# Altium footprint library TH Connectors.PcbLib: 140 footprints (part 5 of 9)
Each footprint in its own frame and in the unit in brackets; x right, y up, seen from the top. Pads: shape width x height; smd on the part's side, far side on the other; paste and mask are expansions set on the pad; w line width, h text height; cw(c..) or ccw(c..) is an arc to the next point about the centre after c.
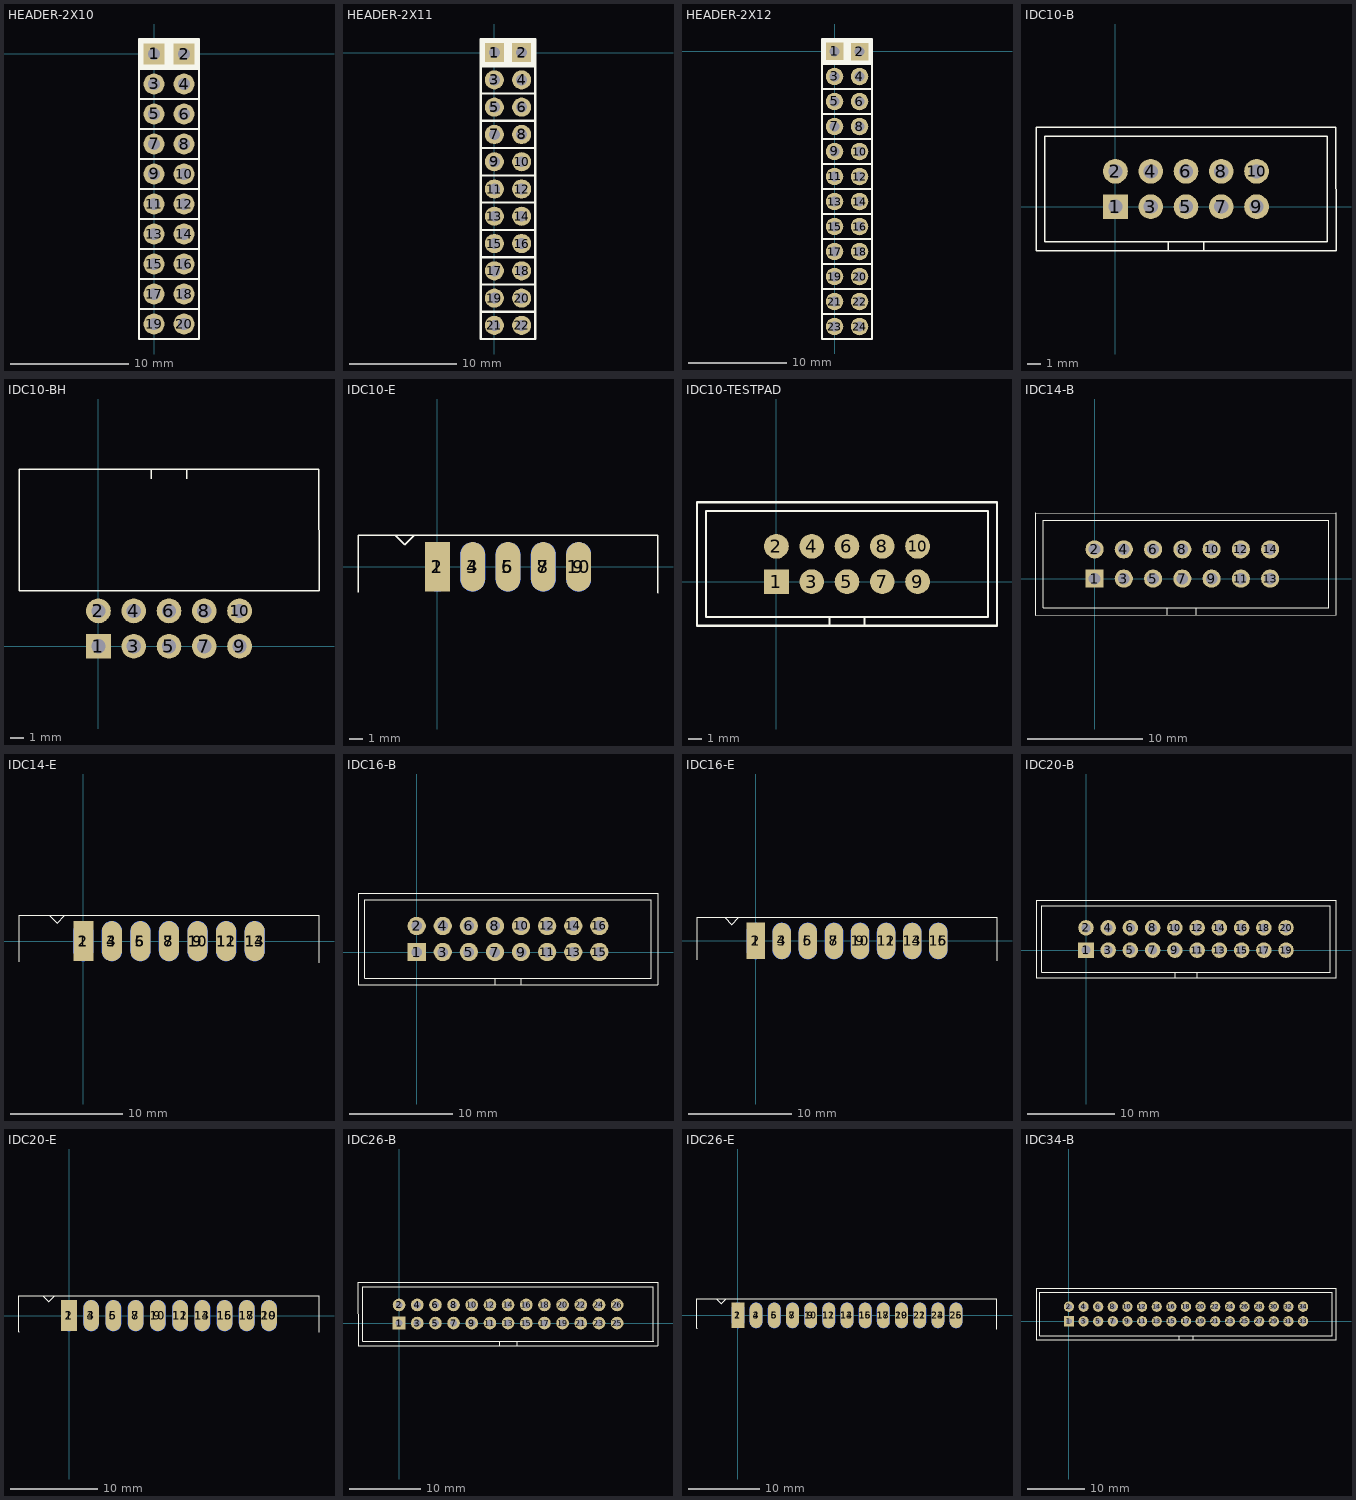
[diagram p4: the footprints below, top view; thin cyan lines are the x and y axes]

## HEADER-2X10 [mil]
pads (20):
  rect 70x70 hole 40: 1(0,0) 2(100,0)
  round 70 hole 40: 3(0,-100) 4(100,-100) 5(0,-200) 6(100,-200) 7(0,-300) 8(100,-300) 9(0,-400) 10(100,-400) 11(0,-500) 12(100,-500) 13(0,-600) 14(100,-600) 15(0,-700) 16(100,-700) 17(0,-800) 18(100,-800) 19(0,-900) 20(100,-900)
Top Overlay:
  rectangle: -50,-49.62 50,50
  rectangle: 50,-49.62 150,50
  lines w8: -50,-250 50,-250 150,-250 ; -50,-150 50,-150 150,-150 ; -50,-50 50,-50 150,-50 ; 50,-850 -50,-850 50,-850 ; 50,-850 150,-850 50,-850 ; 50,-750 -50,-750 50,-750 ; 50,-750 150,-750 50,-750 ; 50,-650 -50,-650 50,-650 ; 50,-650 150,-650 50,-650 ; 50,-550 -50,-550 50,-550 ; 50,-550 150,-550 50,-550 ; 50,-450 -50,-450 50,-450 ; 50,-450 150,-450 50,-450 ; 50,-350 -50,-350 50,-350 ; 50,-350 150,-350 50,-350 ; -50,-950 50,-950 150,-950 150,50 50,50 -50,50 -50,-950
3D body: height 470, standoff -120, extent -15,-215 15,-185
3D body: height 100, standoff 0, extent -50,-950 150,50
3D body: height 470, standoff -120, extent -15,-115 15,-85
3D body: height 470, standoff -120, extent -15,-15 15,15
3D body: height 470, standoff -120, extent -15,-315 15,-285
3D body: height 470, standoff -120, extent -15,-415 15,-385
3D body: height 470, standoff -120, extent -15,-515 15,-485
3D body: height 470, standoff -120, extent -15,-615 15,-585
3D body: height 470, standoff -120, extent -15,-715 15,-685
3D body: height 470, standoff -120, extent -15,-815 15,-785
3D body: height 470, standoff -120, extent -15,-915 15,-885
3D body: height 101, standoff 100, extent -35,-35 35.5,35
3D body: height 101, standoff 100, extent 65,-35 135.5,35
3D body: height 470, standoff -120, extent 85,-915 115,-885
3D body: height 470, standoff -120, extent 85,-815 115,-785
3D body: height 470, standoff -120, extent 85,-715 115,-685
3D body: height 470, standoff -120, extent 85,-615 115,-585
3D body: height 470, standoff -120, extent 85,-515 115,-485
3D body: height 470, standoff -120, extent 85,-415 115,-385
3D body: height 470, standoff -120, extent 85,-315 115,-285
3D body: height 470, standoff -120, extent 85,-15 115,15
3D body: height 470, standoff -120, extent 85,-115 115,-85
3D body: height 470, standoff -120, extent 85,-215 115,-185

## HEADER-2X11 [mil]
pads (22):
  rect 70x70 hole 40: 1(0,0) 2(100,0)
  round 70 hole 40: 3(0,-100) 4(100,-100) 5(0,-200) 6(100,-200) 7(0,-300) 8(100,-300) 9(0,-400) 10(100,-400) 11(0,-500) 12(100,-500) 13(0,-600) 14(100,-600) 15(0,-700) 16(100,-700) 17(0,-800) 18(100,-800) 19(0,-900) 20(100,-900) 21(0,-1000) 22(100,-1000)
Top Overlay:
  rectangle: -50,-49.62 50,50
  rectangle: 50,-49.62 150,50
  lines w8: -50,-1048.5 -50,50 50,50 150,50 150,-1049 ; -50,-950 50,-950 150,-950 ; -50,-250 50,-250 150,-250 ; -50,-150 50,-150 150,-150 ; -50,-50 50,-50 150,-50 ; -50,-1050 50,-1050 ; -50,-1050 50,-1050 ; -50,-1050 50,-1050 ; 50,-1050 150,-1050 ; 50,-1050 150,-1050 ; 50,-1050 150,-1050 ; 50,-850 -50,-850 50,-850 ; 50,-850 150,-850 50,-850 ; 50,-750 -50,-750 50,-750 ; 50,-750 150,-750 50,-750 ; 50,-650 -50,-650 50,-650 ; 50,-650 150,-650 50,-650 ; 50,-550 -50,-550 50,-550 ; 50,-550 150,-550 50,-550 ; 50,-450 -50,-450 50,-450 ; 50,-450 150,-450 50,-450 ; 50,-350 -50,-350 50,-350 ; 50,-350 150,-350 50,-350
3D body: height 470, standoff -120, extent -15,-215 15,-185
3D body: height 100, standoff 0, extent -50,-1050 150,50
3D body: height 470, standoff -120, extent -15,-115 15,-85
3D body: height 470, standoff -120, extent -15,-15 15,15
3D body: height 470, standoff -120, extent -15,-315 15,-285
3D body: height 470, standoff -120, extent -15,-415 15,-385
3D body: height 470, standoff -120, extent -15,-515 15,-485
3D body: height 470, standoff -120, extent -15,-615 15,-585
3D body: height 470, standoff -120, extent -15,-715 15,-685
3D body: height 470, standoff -120, extent -15,-815 15,-785
3D body: height 470, standoff -120, extent -15,-915 15,-885
3D body: height 101, standoff 100, extent -35,-35 35.5,35
3D body: height 470, standoff -120, extent -15,-1015 15,-985
3D body: height 470, standoff -120, extent 85,-1015 115,-985
3D body: height 101, standoff 100, extent 65,-35 135.5,35
3D body: height 470, standoff -120, extent 85,-915 115,-885
3D body: height 470, standoff -120, extent 85,-815 115,-785
3D body: height 470, standoff -120, extent 85,-715 115,-685
3D body: height 470, standoff -120, extent 85,-615 115,-585
3D body: height 470, standoff -120, extent 85,-515 115,-485
3D body: height 470, standoff -120, extent 85,-415 115,-385
3D body: height 470, standoff -120, extent 85,-315 115,-285
3D body: height 470, standoff -120, extent 85,-15 115,15
3D body: height 470, standoff -120, extent 85,-115 115,-85
3D body: height 470, standoff -120, extent 85,-215 115,-185

## HEADER-2X12 [mil]
pads (24):
  rect 70x70 hole 40: 1(0,0) 2(100,0)
  round 70 hole 40: 3(0,-100) 4(100,-100) 5(0,-200) 6(100,-200) 7(0,-300) 8(100,-300) 9(0,-400) 10(100,-400) 11(0,-500) 12(100,-500) 13(0,-600) 14(100,-600) 15(0,-700) 16(100,-700) 17(0,-800) 18(100,-800) 19(0,-900) 20(100,-900) 21(0,-1000) 22(100,-1000) 23(0,-1100) 24(100,-1100)
Top Overlay:
  rectangle: 50,-49.62 150,50
  rectangle: -50,-49.62 50,50
  lines w8: -50,-950 50,-950 150,-950 ; -50,-250 50,-250 150,-250 ; -50,-150 50,-150 150,-150 ; -50,-50 50,-50 150,-50 ; -50,-1150 50,-1150 ; -50,-1150 50,-1150 ; -50,-1150 50,-1150 ; -50,-1150 50,-1150 ; -50,-1150 -50,50 50,50 150,50 150,-1150 ; -50,-1050 50,-1050 ; -50,-1050 50,-1050 ; -50,-1050 50,-1050 ; 50,-1150 150,-1150 ; 50,-1150 150,-1150 ; 50,-1150 150,-1150 ; 50,-1150 150,-1150 ; 50,-1050 150,-1050 ; 50,-1050 150,-1050 ; 50,-1050 150,-1050 ; 50,-850 150,-850 50,-850 ; 50,-850 -50,-850 50,-850 ; 50,-750 150,-750 50,-750 ; 50,-750 -50,-750 50,-750 ; 50,-650 150,-650 50,-650 ; 50,-650 -50,-650 50,-650 ; 50,-550 150,-550 50,-550 ; 50,-550 -50,-550 50,-550 ; 50,-450 150,-450 50,-450 ; 50,-450 -50,-450 50,-450 ; 50,-350 150,-350 50,-350 ; 50,-350 -50,-350 50,-350
3D body: height 470, standoff -120, extent 85,-215 115,-185
3D body: height 470, standoff -120, extent 85,-115 115,-85
3D body: height 470, standoff -120, extent 85,-15 115,15
3D body: height 470, standoff -120, extent 85,-315 115,-285
3D body: height 470, standoff -120, extent 85,-415 115,-385
3D body: height 470, standoff -120, extent 85,-515 115,-485
3D body: height 470, standoff -120, extent 85,-615 115,-585
3D body: height 470, standoff -120, extent 85,-715 115,-685
3D body: height 470, standoff -120, extent 85,-815 115,-785
3D body: height 470, standoff -120, extent 85,-915 115,-885
3D body: height 101, standoff 100, extent 65,-35 135.5,35
3D body: height 470, standoff -120, extent 85,-1015 115,-985
3D body: height 470, standoff -120, extent 85,-1115 115,-1085
3D body: height 470, standoff -120, extent -15,-1115 15,-1085
3D body: height 470, standoff -120, extent -15,-1015 15,-985
3D body: height 101, standoff 100, extent -35,-35 35.5,35
3D body: height 470, standoff -120, extent -15,-915 15,-885
3D body: height 470, standoff -120, extent -15,-815 15,-785
3D body: height 470, standoff -120, extent -15,-715 15,-685
3D body: height 470, standoff -120, extent -15,-615 15,-585
3D body: height 470, standoff -120, extent -15,-515 15,-485
3D body: height 470, standoff -120, extent -15,-415 15,-385
3D body: height 470, standoff -120, extent -15,-315 15,-285
3D body: height 470, standoff -120, extent -15,-15 15,15
3D body: height 470, standoff -120, extent -15,-115 15,-85
3D body: height 100, standoff 0, extent -50,-1150 150,50
3D body: height 470, standoff -120, extent -15,-215 15,-185

## IDC10-B [mil]
pads (10):
  rect 70x70 hole 40: 1(0,0)
  round 70 hole 40: 2(0,100) 3(100,0) 4(100,100) 5(200,0) 6(200,100) 7(300,0) 8(300,100) 9(400,0) 10(400,100)
Top Overlay:
  lines w4: 150,-125 150,-100 600,-100 600,200 -200,200 -200,-100 250,-100 250,-125 ; -225,-125 -225,225 625,225 625,-125 -225,-125
3D body: height 300, standoff -120, extent -12.5,-12.5 12.5,12.5
3D body: height 300, standoff -120, extent 87.5,-12.5 112.5,12.5
3D body: height 300, standoff -120, extent 187.5,-12.5 212.5,12.5
3D body: height 300, standoff -120, extent 287.5,-12.5 312.5,12.5
3D body: height 300, standoff -120, extent 387.5,-12.5 412.5,12.5
3D body: height 300, standoff -120, extent 387.5,87.5 412.5,112.5
3D body: height 300, standoff -120, extent 287.5,87.5 312.5,112.5
3D body: height 300, standoff -120, extent 187.5,87.5 212.5,112.5
3D body: height 300, standoff -120, extent 87.5,87.5 112.5,112.5
3D body: height 300, standoff -120, extent -12.5,87.5 12.5,112.5
3D body: height 102.36, standoff 0, extent -225,-125 625,225
3D body: height 358.27, standoff 0, extent -225,-125 625,225

## IDC10-BH [mil]
pads (10):
  rect 70x70 hole 40: 1(0,0)
  round 70 hole 40: 2(0,100) 3(100,0) 4(100,100) 5(200,0) 6(200,100) 7(300,0) 8(300,100) 9(400,0) 10(400,100)
Top Overlay:
  lines w4: 150,475 150,500 ; 250,475 250,500 ; -225,157 625,157 625,501 -225,501 -225,157
3D body: height 343, standoff 342, extent -27.75,367 24.75,482
3D body: height 230, standoff 205, extent 387.5,-12.5 412.5,461.5
3D body: height 230, standoff 205, extent 287.5,-12.5 312.5,461.5
3D body: height 230, standoff 205, extent 187.5,-12.5 212.5,461.5
3D body: height 230, standoff 205, extent 87.5,-12.5 112.5,461.5
3D body: height 230, standoff 205, extent -12.5,-12.5 12.5,461.5
3D body: height 145, standoff 120, extent -12.5,87.5 12.5,461.5
3D body: height 145, standoff 120, extent 87.5,87.5 112.5,461.5
3D body: height 145, standoff 120, extent 187.5,87.5 212.5,461.5
3D body: height 145, standoff 120, extent 287.5,87.5 312.5,461.5
3D body: height 145, standoff 120, extent 387.5,87.5 412.5,461.5
3D body: height 120, standoff -120, extent -12.5,87.5 12.5,112.5
3D body: height 120, standoff -120, extent 87.5,87.5 112.5,112.5
3D body: height 120, standoff -120, extent 187.5,87.5 212.5,112.5
3D body: height 120, standoff -120, extent 287.5,87.5 312.5,112.5
3D body: height 120, standoff -120, extent 387.5,87.5 412.5,112.5
3D body: height 230, standoff -120, extent 387.5,-12.5 412.5,12.5
3D body: height 230, standoff -120, extent 287.5,-12.5 312.5,12.5
3D body: height 230, standoff -120, extent 187.5,-12.5 212.5,12.5
3D body: height 230, standoff -120, extent 87.5,-12.5 112.5,12.5
3D body: height 230, standoff -120, extent -12.5,-12.5 12.5,12.5
3D body: height 39.37, standoff 0, extent -224.5,157.5 625,501
3D body: height 342, standoff 0, extent 586.5,157.5 625,501
3D body: height 342, standoff 0, extent -224.5,157.5 625,243
3D body: height 342, standoff 0, extent -224.5,157.5 -186,501
3D body: height 342, standoff 300, extent -225.5,157.5 625.5,500.5

## IDC10-E [mil]
pads (10):
  rect 70x140 smd: 1(0,0)
  oval 70x140 smd far side: 2(0,0) 4(100,0) 6(200,0) 8(300,0) 10(400,0)
  oval 70x140 smd: 3(100,0) 5(200,0) 7(300,0) 9(400,0)
Top Overlay:
  lines w4: -119,90 -92,63 -65,90 ; -225,-72 -225,-72 ; -225,-72 -225,90 625,90 625,-74 ; 625,-74 625,-74
3D body: height 150, standoff -150, extent -224.5,97.5 -186,441
3D body: height 150, standoff -150, extent 586.5,97.5 625,441
3D body: height 151, standoff 150, extent -27.75,307 24.75,422
3D body: height 30, standoff 10, extent 387.5,-72.5 412.5,401.5
3D body: height 30, standoff 10, extent 287.5,-72.5 312.5,401.5
3D body: height 30, standoff 10, extent 187.5,-72.5 212.5,401.5
3D body: height 30, standoff 10, extent 87.5,-72.5 112.5,401.5
3D body: height 30, standoff 10, extent -12.5,-72.5 12.5,401.5
3D body: height 30, standoff 10, extent -12.5,-72.5 12.5,401.5
3D body: height 30, standoff 10, extent 87.5,-72.5 112.5,401.5
3D body: height 30, standoff 10, extent 187.5,-72.5 212.5,401.5
3D body: height 30, standoff 10, extent 287.5,-72.5 312.5,401.5
3D body: height 30, standoff 10, extent 387.5,-72.5 412.5,401.5
3D body: height 150, standoff 120, extent -224.5,97.5 625,441
3D body: height 150, standoff -150, extent 586.5,97.5 625,441
3D body: height 150, standoff -150, extent -224.5,97.5 625,183
3D body: height 150, standoff -150, extent -224.5,97.5 -186,441
3D body: height 150, standoff 120, extent -225.5,97.5 625.5,440.5
3D body: height 150, standoff -150, extent -224.5,97.5 625,183

## IDC10-TESTPAD [mil]
pads (10):
  rect 70x70 smd: 1(0,0)
  round 70 smd: 2(0,100) 3(100,0) 4(100,100) 5(200,0) 6(200,100) 7(300,0) 8(300,100) 9(400,0) 10(400,100)
Top Overlay:
  lines w6: 150,-125 150,-100 600,-100 600,200 -200,200 -200,-100 250,-100 250,-125 ; -225,-125 625,-125 625,225 -225,225 -225,-125

## IDC14-B [mil]
pads (14):
  rect 62x62 hole 40: 1(0,0)
  round 62 hole 40: 2(0,100) 3(100,0) 4(100,100) 5(200,0) 6(200,100) 7(300,0) 8(300,100) 9(400,0) 10(400,100) 11(500,0) 12(500,100) 13(600,0) 14(600,100)
Top Overlay:
  lines w4: 248,-125 248,-100 ; 348,-125 348,-100 ; 824,224 -200,225 -200,-125 825,-124 ; 825,-125 825,225 ; -175,-100 -175,200 800,200 800,-100 300,-100 -175,-100
3D body: height 300, standoff -120, extent 587.5,87.5 612.5,112.5
3D body: height 300, standoff -120, extent 587.5,-12.5 612.5,12.5
3D body: height 300, standoff -120, extent 487.5,87.5 512.5,112.5
3D body: height 300, standoff -120, extent 487.5,-12.5 512.5,12.5
3D body: height 300, standoff -120, extent -12.5,-12.5 12.5,12.5
3D body: height 300, standoff -120, extent 87.5,-12.5 112.5,12.5
3D body: height 300, standoff -120, extent 187.5,-12.5 212.5,12.5
3D body: height 300, standoff -120, extent 287.5,-12.5 312.5,12.5
3D body: height 300, standoff -120, extent 387.5,-12.5 412.5,12.5
3D body: height 300, standoff -120, extent 387.5,87.5 412.5,112.5
3D body: height 300, standoff -120, extent 287.5,87.5 312.5,112.5
3D body: height 300, standoff -120, extent 187.5,87.5 212.5,112.5
3D body: height 300, standoff -120, extent 87.5,87.5 112.5,112.5
3D body: height 300, standoff -120, extent -12.5,87.5 12.5,112.5
3D body: height 102.36, standoff 0, extent -200.5,-125 825,225
3D body: height 358.27, standoff 0, extent -201.5,-125 824.5,225

## IDC14-E [mil] "idc14 edge soldered"
pads (14):
  rect 70x140 smd: 1(0,0)
  oval 70x140 smd far side: 2(0,0) 4(100,0) 6(200,0) 8(300,0) 10(400,0) 12(500,0) 14(600,0)
  oval 70x140 smd: 3(100,0) 5(200,0) 7(300,0) 9(400,0) 11(500,0) 13(600,0)
Top Overlay:
  lines w4: -119,90 -92,63 -65,90 ; 825,-75 825,90 -225,90 -225,-72 ; -225,-72 -225,-72
3D body: height 30, standoff 10, extent 587.5,-72.5 612.5,401.5
3D body: height 30, standoff 10, extent 487.5,-72.5 512.5,401.5
3D body: height 30, standoff 10, extent 487.5,-72.5 512.5,401.5
3D body: height 30, standoff 10, extent 587.5,-72.5 612.5,401.5
3D body: height 150, standoff 120, extent -225.5,97.5 825,440.5
3D body: height 150, standoff -150, extent -224.5,97.5 -186,441
3D body: height 150, standoff -150, extent -224.5,97.5 825,183
3D body: height 150, standoff -150, extent 786.5,97.5 825,441
3D body: height 150, standoff 120, extent -224.5,97.5 825,441
3D body: height 30, standoff 10, extent 387.5,-72.5 412.5,401.5
3D body: height 30, standoff 10, extent 287.5,-72.5 312.5,401.5
3D body: height 30, standoff 10, extent 187.5,-72.5 212.5,401.5
3D body: height 30, standoff 10, extent 87.5,-72.5 112.5,401.5
3D body: height 30, standoff 10, extent -12.5,-72.5 12.5,401.5
3D body: height 30, standoff 10, extent -12.5,-72.5 12.5,401.5
3D body: height 30, standoff 10, extent 87.5,-72.5 112.5,401.5
3D body: height 30, standoff 10, extent 187.5,-72.5 212.5,401.5
3D body: height 30, standoff 10, extent 287.5,-72.5 312.5,401.5
3D body: height 30, standoff 10, extent 387.5,-72.5 412.5,401.5
3D body: height 151, standoff 150, extent -27.75,307 24.75,422
3D body: height 150, standoff -150, extent 786.5,97.5 825,441
3D body: height 150, standoff -150, extent -224.5,97.5 -186,441
3D body: height 150, standoff -150, extent -224.5,97.5 825,183

## IDC16-B [mil]
pads (16):
  rect 70x70 hole 40: 1(0,0)
  round 70 hole 40: 2(0,100) 3(100,0) 4(100,100) 5(200,0) 6(200,100) 7(300,0) 8(300,100) 9(400,0) 10(400,100) 11(500,0) 12(500,100) 13(600,0) 14(600,100) 15(700,0) 16(700,100)
Top Overlay:
  lines w4: 300,-125 300,-100 ; 400,-125 400,-100 ; -225,-125 -225,225 925,225 925,-125 -225,-125 ; -200,-100 900,-100 900,200 -200,200 -200,-100
3D body: height 300, standoff -120, extent 687.5,-12.5 712.5,12.5
3D body: height 300, standoff -120, extent 687.5,87.5 712.5,112.5
3D body: height 300, standoff -120, extent 587.5,87.5 612.5,112.5
3D body: height 300, standoff -120, extent 587.5,-12.5 612.5,12.5
3D body: height 300, standoff -120, extent 487.5,87.5 512.5,112.5
3D body: height 300, standoff -120, extent 487.5,-12.5 512.5,12.5
3D body: height 300, standoff -120, extent -12.5,-12.5 12.5,12.5
3D body: height 300, standoff -120, extent 87.5,-12.5 112.5,12.5
3D body: height 300, standoff -120, extent 187.5,-12.5 212.5,12.5
3D body: height 300, standoff -120, extent 287.5,-12.5 312.5,12.5
3D body: height 300, standoff -120, extent 387.5,-12.5 412.5,12.5
3D body: height 300, standoff -120, extent 387.5,87.5 412.5,112.5
3D body: height 300, standoff -120, extent 287.5,87.5 312.5,112.5
3D body: height 300, standoff -120, extent 187.5,87.5 212.5,112.5
3D body: height 300, standoff -120, extent 87.5,87.5 112.5,112.5
3D body: height 300, standoff -120, extent -12.5,87.5 12.5,112.5
3D body: height 102.36, standoff 0, extent -225,-125 924.5,225
3D body: height 358.27, standoff 0, extent -224.5,-125 925.5,225

## IDC16-E [mil] "idc16 edge soldered"
pads (16):
  rect 70x140 smd: 1(0,0)
  oval 70x140 smd far side: 2(0,0) 4(100,0) 6(200,0) 8(300,0) 10(400,0) 12(500,0) 14(600,0) 16(700,0)
  oval 70x140 smd: 3(100,0) 5(200,0) 7(300,0) 9(400,0) 11(500,0) 13(600,0) 15(700,0)
Top Overlay:
  lines w4: -119,90 -92,63 -65,90 ; 925,-75 925,90 -225,90 -225,-72 ; -225,-72 -225,-72
3D body: height 30, standoff 10, extent 587.5,-72.5 612.5,401.5
3D body: height 30, standoff 10, extent 487.5,-72.5 512.5,401.5
3D body: height 30, standoff 10, extent 487.5,-72.5 512.5,401.5
3D body: height 30, standoff 10, extent 587.5,-72.5 612.5,401.5
3D body: height 150, standoff 120, extent -225.5,97.5 925,440.5
3D body: height 150, standoff -150, extent -224.5,97.5 -186,441
3D body: height 150, standoff -150, extent -224.5,97.5 925,183
3D body: height 150, standoff 120, extent -224.5,97.5 925,441
3D body: height 30, standoff 10, extent 387.5,-72.5 412.5,401.5
3D body: height 30, standoff 10, extent 287.5,-72.5 312.5,401.5
3D body: height 30, standoff 10, extent 187.5,-72.5 212.5,401.5
3D body: height 30, standoff 10, extent 87.5,-72.5 112.5,401.5
3D body: height 30, standoff 10, extent -12.5,-72.5 12.5,401.5
3D body: height 30, standoff 10, extent -12.5,-72.5 12.5,401.5
3D body: height 30, standoff 10, extent 87.5,-72.5 112.5,401.5
3D body: height 30, standoff 10, extent 187.5,-72.5 212.5,401.5
3D body: height 30, standoff 10, extent 287.5,-72.5 312.5,401.5
3D body: height 30, standoff 10, extent 387.5,-72.5 412.5,401.5
3D body: height 151, standoff 150, extent -27.75,307 24.75,422
3D body: height 150, standoff -150, extent -224.5,97.5 -186,441
3D body: height 150, standoff -150, extent -224.5,97.5 925,183
3D body: height 150, standoff -150, extent 886.5,97.5 925,441
3D body: height 150, standoff -150, extent 886.5,97.5 925,441
3D body: height 30, standoff 10, extent 687.5,-72.5 712.5,401.5
3D body: height 30, standoff 10, extent 687.5,-72.5 712.5,401.5

## IDC20-B [mil]
pads (20):
  rect 70x70 hole 40: 1(0,0)
  round 70 hole 40: 2(0,100) 3(100,0) 4(100,100) 5(200,0) 6(200,100) 7(300,0) 8(300,100) 9(400,0) 10(400,100) 11(500,0) 12(500,100) 13(600,0) 14(600,100) 15(700,0) 16(700,100) 17(800,0) 18(800,100) 19(900,0) 20(900,100)
Top Overlay:
  lines w4: 150,-100 1100,-100 1100,200 -200,200 -200,-100 250,-100 ; 400,-125 400,-100 ; 500,-125 500,-100 ; -225,-125 -225,225 1125,225 1125,-125 -225,-125
3D body: height 300, standoff -120, extent 887.5,87.5 912.5,112.5
3D body: height 300, standoff -120, extent 887.5,-12.5 912.5,12.5
3D body: height 300, standoff -120, extent 787.5,87.5 812.5,112.5
3D body: height 300, standoff -120, extent 787.5,-12.5 812.5,12.5
3D body: height 300, standoff -120, extent 687.5,-12.5 712.5,12.5
3D body: height 300, standoff -120, extent 687.5,87.5 712.5,112.5
3D body: height 300, standoff -120, extent 587.5,87.5 612.5,112.5
3D body: height 300, standoff -120, extent 587.5,-12.5 612.5,12.5
3D body: height 300, standoff -120, extent 487.5,87.5 512.5,112.5
3D body: height 300, standoff -120, extent 487.5,-12.5 512.5,12.5
3D body: height 300, standoff -120, extent -12.5,-12.5 12.5,12.5
3D body: height 300, standoff -120, extent 87.5,-12.5 112.5,12.5
3D body: height 300, standoff -120, extent 187.5,-12.5 212.5,12.5
3D body: height 300, standoff -120, extent 287.5,-12.5 312.5,12.5
3D body: height 300, standoff -120, extent 387.5,-12.5 412.5,12.5
3D body: height 300, standoff -120, extent 387.5,87.5 412.5,112.5
3D body: height 300, standoff -120, extent 287.5,87.5 312.5,112.5
3D body: height 300, standoff -120, extent 187.5,87.5 212.5,112.5
3D body: height 300, standoff -120, extent 87.5,87.5 112.5,112.5
3D body: height 300, standoff -120, extent -12.5,87.5 12.5,112.5
3D body: height 102.36, standoff 0, extent -225,-125 1124.5,225
3D body: height 358.27, standoff 0, extent -224.5,-125 1125,225

## IDC20-E [mil] "IDC20 EDGE SOLDERED"
pads (20):
  rect 70x140 smd: 1(0,0)
  oval 70x140 smd far side: 2(0,0) 4(100,0) 6(200,0) 8(300,0) 10(400,0) 12(500,0) 14(600,0) 16(700,0) 18(800,0) 20(900,0)
  oval 70x140 smd: 3(100,0) 5(200,0) 7(300,0) 9(400,0) 11(500,0) 13(600,0) 15(700,0) 17(800,0) 19(900,0)
Top Overlay:
  lines w4: -119,90 -92,63 -65,90 ; 1125,-75 1125,90 -225,90 -225,-72 ; -225,-72 -225,-72
3D body: height 30, standoff 10, extent 587.5,-72.5 612.5,401.5
3D body: height 30, standoff 10, extent 487.5,-72.5 512.5,401.5
3D body: height 30, standoff 10, extent 487.5,-72.5 512.5,401.5
3D body: height 30, standoff 10, extent 587.5,-72.5 612.5,401.5
3D body: height 150, standoff 120, extent -225.5,97.5 1125,440.5
3D body: height 150, standoff -150, extent -224.5,97.5 -186,441
3D body: height 150, standoff -150, extent -224.5,97.5 1125,183
3D body: height 150, standoff 120, extent -224.5,97.5 1125,441
3D body: height 30, standoff 10, extent 387.5,-72.5 412.5,401.5
3D body: height 30, standoff 10, extent 287.5,-72.5 312.5,401.5
3D body: height 30, standoff 10, extent 187.5,-72.5 212.5,401.5
3D body: height 30, standoff 10, extent 87.5,-72.5 112.5,401.5
3D body: height 30, standoff 10, extent -12.5,-72.5 12.5,401.5
3D body: height 30, standoff 10, extent -12.5,-72.5 12.5,401.5
3D body: height 30, standoff 10, extent 87.5,-72.5 112.5,401.5
3D body: height 30, standoff 10, extent 187.5,-72.5 212.5,401.5
3D body: height 30, standoff 10, extent 287.5,-72.5 312.5,401.5
3D body: height 30, standoff 10, extent 387.5,-72.5 412.5,401.5
3D body: height 151, standoff 150, extent -27.75,307 24.75,422
3D body: height 150, standoff -150, extent -224.5,97.5 -186,441
3D body: height 150, standoff -150, extent -224.5,97.5 1125,183
3D body: height 150, standoff -150, extent 1086.5,97.5 1125,441
3D body: height 30, standoff 10, extent 687.5,-72.5 712.5,401.5
3D body: height 30, standoff 10, extent 687.5,-72.5 712.5,401.5
3D body: height 150, standoff -150, extent 1086.5,97.5 1125,441
3D body: height 30, standoff 10, extent 887.5,-72.5 912.5,401.5
3D body: height 30, standoff 10, extent 787.5,-72.5 812.5,401.5
3D body: height 30, standoff 10, extent 787.5,-72.5 812.5,401.5
3D body: height 30, standoff 10, extent 887.5,-72.5 912.5,401.5

## IDC26-B [mil]
pads (26):
  rect 70x70 hole 40: 1(0,0)
  round 70 hole 40: 2(0,100) 3(100,0) 4(100,100) 5(200,0) 6(200,100) 7(300,0) 8(300,100) 9(400,0) 10(400,100) 11(500,0) 12(500,100) 13(600,0) 14(600,100) 15(700,0) 16(700,100) 17(800,0) 18(800,100) 19(900,0) 20(900,100) 21(1000,0) 22(1000,100) 23(1100,0) 24(1100,100) 25(1200,0) 26(1200,100)
Top Overlay:
  lines w4: 150,-100 1400.39,-100 ; 250,-100 -200,-100 -200,200 1399.41,200 ; 550.2,-125 550.2,-100 ; 650.2,-125 650.2,-100 ; 1400,-100 1400,200 ; 1424.41,-125 -225,-125 -225.98,225 1424.41,225 ; 1425,-125 1425,225
3D body: height 300, standoff -120, extent 887.5,87.5 912.5,112.5
3D body: height 300, standoff -120, extent 887.5,-12.5 912.5,12.5
3D body: height 300, standoff -120, extent 787.5,87.5 812.5,112.5
3D body: height 300, standoff -120, extent 787.5,-12.5 812.5,12.5
3D body: height 300, standoff -120, extent 687.5,-12.5 712.5,12.5
3D body: height 300, standoff -120, extent 687.5,87.5 712.5,112.5
3D body: height 300, standoff -120, extent 587.5,87.5 612.5,112.5
3D body: height 300, standoff -120, extent 587.5,-12.5 612.5,12.5
3D body: height 300, standoff -120, extent 487.5,87.5 512.5,112.5
3D body: height 300, standoff -120, extent 487.5,-12.5 512.5,12.5
3D body: height 300, standoff -120, extent -12.5,-12.5 12.5,12.5
3D body: height 300, standoff -120, extent 87.5,-12.5 112.5,12.5
3D body: height 300, standoff -120, extent 187.5,-12.5 212.5,12.5
3D body: height 300, standoff -120, extent 287.5,-12.5 312.5,12.5
3D body: height 300, standoff -120, extent 387.5,-12.5 412.5,12.5
3D body: height 300, standoff -120, extent 387.5,87.5 412.5,112.5
3D body: height 300, standoff -120, extent 287.5,87.5 312.5,112.5
3D body: height 300, standoff -120, extent 187.5,87.5 212.5,112.5
3D body: height 300, standoff -120, extent 87.5,87.5 112.5,112.5
3D body: height 300, standoff -120, extent -12.5,87.5 12.5,112.5
3D body: height 102.36, standoff 0, extent -225,-125 1425,225
3D body: height 358.27, standoff 0, extent -224.5,-125 1425,225
3D body: height 300, standoff -120, extent 987.5,-12.5 1012.5,12.5
3D body: height 300, standoff -120, extent 987.5,87.5 1012.5,112.5
3D body: height 300, standoff -120, extent 1087.5,-12.5 1112.5,12.5
3D body: height 300, standoff -120, extent 1087.5,87.5 1112.5,112.5
3D body: height 300, standoff -120, extent 1187.5,-12.5 1212.5,12.5
3D body: height 300, standoff -120, extent 1187.5,87.5 1212.5,112.5

## IDC26-E [mil] "IDC26 EDGE SOLDERED"
pads (26):
  rect 70x140 smd: 1(0,0)
  oval 70x140 smd far side: 2(0,0) 4(100,0) 6(200,0) 8(300,0) 10(400,0) 12(500,0) 14(600,0) 16(700,0) 18(800,0) 20(900,0) 22(1000,0) 24(1100,0) 26(1200,0)
  oval 70x140 smd: 3(100,0) 5(200,0) 7(300,0) 9(400,0) 11(500,0) 13(600,0) 15(700,0) 17(800,0) 19(900,0) 21(1000,0) 23(1100,0) 25(1200,0)
Top Overlay:
  lines w4: -119,90 -92,63 -65,90 ; 1425,-75 1425,90 -225,90 -225,-72 ; -225,-72 -225,-72
3D body: height 30, standoff 10, extent 1187.5,-72.5 1212.5,401.5
3D body: height 30, standoff 10, extent 1087.5,-72.5 1112.5,401.5
3D body: height 30, standoff 10, extent 1087.5,-72.5 1112.5,401.5
3D body: height 30, standoff 10, extent 1187.5,-72.5 1212.5,401.5
3D body: height 150, standoff -150, extent 1386.5,97.5 1425,441
3D body: height 30, standoff 10, extent 987.5,-72.5 1012.5,401.5
3D body: height 30, standoff 10, extent 987.5,-72.5 1012.5,401.5
3D body: height 150, standoff -150, extent 1386.5,97.5 1425,441
3D body: height 30, standoff 10, extent 587.5,-72.5 612.5,401.5
3D body: height 30, standoff 10, extent 487.5,-72.5 512.5,401.5
3D body: height 30, standoff 10, extent 487.5,-72.5 512.5,401.5
3D body: height 30, standoff 10, extent 587.5,-72.5 612.5,401.5
3D body: height 150, standoff 120, extent -225.5,97.5 1425,440.5
3D body: height 150, standoff -150, extent -224.5,97.5 -186,441
3D body: height 150, standoff -150, extent -224.5,97.5 1425,183
3D body: height 150, standoff 120, extent -224.5,97.5 1425,441
3D body: height 30, standoff 10, extent 387.5,-72.5 412.5,401.5
3D body: height 30, standoff 10, extent 287.5,-72.5 312.5,401.5
3D body: height 30, standoff 10, extent 187.5,-72.5 212.5,401.5
3D body: height 30, standoff 10, extent 87.5,-72.5 112.5,401.5
3D body: height 30, standoff 10, extent -12.5,-72.5 12.5,401.5
3D body: height 30, standoff 10, extent -12.5,-72.5 12.5,401.5
3D body: height 30, standoff 10, extent 87.5,-72.5 112.5,401.5
3D body: height 30, standoff 10, extent 187.5,-72.5 212.5,401.5
3D body: height 30, standoff 10, extent 287.5,-72.5 312.5,401.5
3D body: height 30, standoff 10, extent 387.5,-72.5 412.5,401.5
3D body: height 151, standoff 150, extent -27.75,307 24.75,422
3D body: height 150, standoff -150, extent -224.5,97.5 -186,441
3D body: height 150, standoff -150, extent -224.5,97.5 1425,183
3D body: height 30, standoff 10, extent 687.5,-72.5 712.5,401.5
3D body: height 30, standoff 10, extent 687.5,-72.5 712.5,401.5
3D body: height 30, standoff 10, extent 887.5,-72.5 912.5,401.5
3D body: height 30, standoff 10, extent 787.5,-72.5 812.5,401.5
3D body: height 30, standoff 10, extent 787.5,-72.5 812.5,401.5
3D body: height 30, standoff 10, extent 887.5,-72.5 912.5,401.5

## IDC34-B [mil]
pads (34):
  rect 70x70 hole 40: 1(0,0)
  round 70 hole 40: 2(0,100) 3(100,0) 4(100,100) 5(200,0) 6(200,100) 7(300,0) 8(300,100) 9(400,0) 10(400,100) 11(500,0) 12(500,100) 13(600,0) 14(600,100) 15(700,0) 16(700,100) 17(800,0) 18(800,100) 19(900,0) 20(900,100) 21(1000,0) 22(1000,100) 23(1100,0) 24(1100,100) 25(1200,0) 26(1200,100) 27(1300,0) 28(1300,100) 29(1400,0) 30(1400,100) 31(1500,0) 32(1500,100) 33(1600,0) 34(1600,100)
Top Overlay:
  lines w4: 150,-100 1800,-100 1800,200 -200,200 -200,-100 250,-100 ; 750,-125 750,-100 ; 850,-125 850,-100 ; -225,-125 1825,-125 1825,225 -225,225 -225,-125